# Altium footprint library Indruino.PcbLib: 383 footprints (part 1 of 24)
Each footprint in its own frame and in the unit in brackets; x right, y up, seen from the top. Pads: shape width x height; smd on the part's side, far side on the other; paste and mask are expansions set on the pad; w line width, h text height; cw(c..) or ccw(c..) is an arc to the next point about the centre after c.
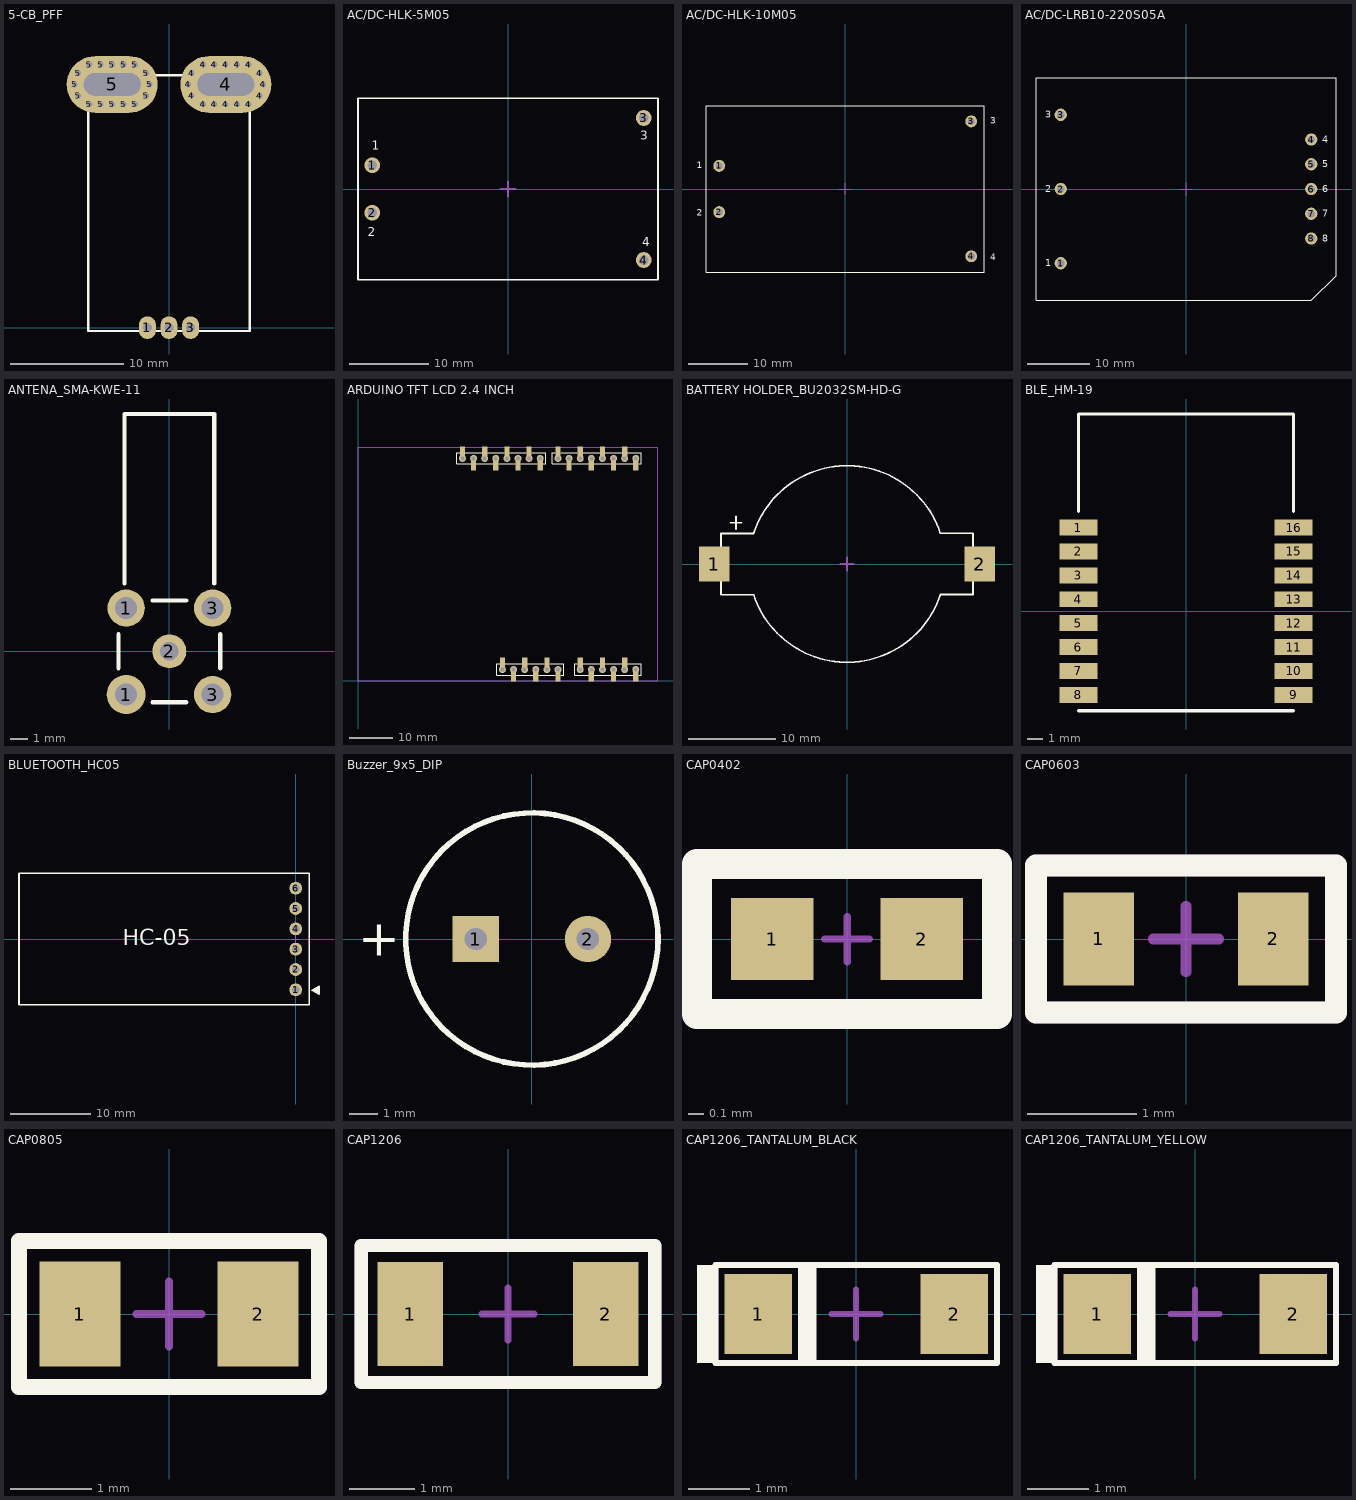
[diagram p0: the footprints below, top view; thin cyan lines are the x and y axes]

## 5-CB_PFF [mm] "ACS759KCB-150B-PFF-T"
pads (37):
  oval 1.5x2 hole 0.8: 1(-1.9,0) 2(0,0) 3(1.9,0)
  round 1 hole 0.5: 4(1.7,21.4) 4(2,20.4) 4(2,22.4) 4(3,19.65) 4(3,23.15) 4(4,19.65) 4(4,23.15) 4(5,19.65) 4(5,23.15) 4(6,19.65) 4(6,23.15) 4(7,19.65) 4(7,23.15) 4(8,20.4) 4(8,22.4) 4(8.3,21.4) 5(-8.3,21.4) 5(-8,20.4) 5(-8,22.4) 5(-7,19.65) 5(-7,23.15) 5(-6,19.65) 5(-6,23.15) 5(-5,19.65) 5(-5,23.15) 5(-4,19.65) 5(-4,23.15) 5(-3,19.65) 5(-3,23.15) 5(-2,20.4) 5(-2,22.4) 5(-1.7,21.4)
  oval 8x5 hole 2 slot 5 at 0 deg: 4(5,21.4) 5(-5,21.4)
Top Overlay:
  lines w0.2: -7.1,-0.3 -7.1,22.2 7.1,22.2 7.1,-0.3 -7.1,-0.3
3D body "User Library-ACS759xCB.step": height 7.1, standoff -3.4, extent -7,-0.25 7,22.09

## AC/DC-HLK-5M05 [mm] "100~240VAC to 5VDC 1A Power Supply Module"
pads (4):
  round 2 hole 1.2: 1(-17.2,3) 2(-17.2,-3) 3(17.2,9) 4(17.2,-9)
Top Overlay:
  lines w0.2: -19,-11.5 -19,11.5 19,11.5 19,-11.5 -19,-11.5
  text "1" at -17.25,5 h1.1
  text "2" at -17.75,-6 h1.1
  text "3" at 16.75,6.25 h1.1
  text "4" at 17,-7.25 h1.1
Mechanical 15:
  lines w0.2: -1,0 1,0 ; 0,-1 0,1
3D body: height 18, standoff 0, extent -19,-11.5 19,11.5

## AC/DC-HLK-10M05 [mm] "85~265VAC to 5VDC 2A Power Supply Module"
pads (4):
  round 2 hole 1.2: 1(-21.25,3.9) 2(-21.25,-3.9) 3(21.25,11.4) 4(21.25,-11.35)
Top Overlay:
  lines w0.2: -23.45,-14 23.45,-14 23.45,14 -23.45,14 -23.45,-14
  text "4" at 24.5,-12 h1.1
  text "3" at 24.5,11 h1.1
  text "2" at -25,-4.5 h1.1
  text "1" at -25,3.5 h1.1
Mechanical 15:
  lines w0.2: -1,0 1,0 ; 0,-1 0,1
3D body: height 21.8, standoff 0, extent -23.45,-14 23.5,14

## AC/DC-LRB10-220S05A [mm] "85~265VAC to 5VDC 2A Power Supply Module"
pads (8):
  round 2 hole 1.2: 1(-20.25,-12) 2(-20.25,0) 3(-20.25,12) 4(20.25,8) 5(20.25,4) 6(20.25,0) 7(20.25,-4) 8(20.25,-8)
Top Overlay:
  lines w0.2: -24.25,-18 20.25,-18 24.25,-14 24.25,18 -24.25,18 -24.25,-18
  text "8" at 22,-8.5 h1.1
  text "7" at 22,-4.5 h1.1
  text "6" at 22,-0.5 h1.1
  text "5" at 22,3.5 h1.1
  text "4" at 22,7.5 h1.1
  text "3" at -22.75,11.5 h1.1
  text "2" at -22.75,-0.5 h1.1
  text "1" at -22.75,-12.5 h1.1
Mechanical 15:
  lines w0.2: -1,0 1,0 ; 0,-1 0,1
3D body: height 20, standoff 0, extent -24.25,-18 24.25,18

## ANTENA_SMA-KWE-11 [mm]
pads (5):
  round 2.3 hole 1.3: 1(-2.55,-2.55)
  round 2.2 hole 1.3: 1(-2.55,2.55) 3(2.55,-2.55) 3(2.55,2.55)
  round 2 hole 1.1: 2(0,0)
Top Overlay:
  lines w0.254: -3,-1 -3,1 ; -2.65,4 -2.65,14 2.65,14 2.65,4 ; -1,-3 1,-3 ; -1,3 1,3 ; 3,-1 3,1
3D body "SMA-KWE-RA-11.STEP": height 7.99, standoff -2.99, extent -3.175,-3 3.175,14

## ARDUINO TFT LCD 2.4 INCH [mm]
pads (56):
  rect 1.2x2.5 smd: 2(63.5,49.3) 3(60.96,52.3) 4(58.42,49.3) 5(55.88,52.3) 6(53.34,49.3) 11(50.8,52.3) 12(48.26,49.3) 13(45.72,52.3) 14(41.656,49.3) 15(39.116,52.3) 16(36.576,49.3) 17(34.036,52.3) 18(31.496,49.3) 19(28.956,52.3) 23(50.8,4.04) 24(53.34,1.04) 25(55.88,4.04) 26(58.42,1.04) 27(60.96,4.04) 28(63.5,1.04) 31(33.02,4.04) 32(35.56,1.04) 33(38.1,4.04) 34(40.64,1.04) 35(43.18,4.04) 36(45.72,1.04) 45(23.876,52.3) 46(26.416,49.3)
  round 1.6 hole 0.9: 2(63.5,50.8) 3(60.96,50.8) 4(58.42,50.8) 5(55.88,50.8) 6(53.34,50.8) 11(50.8,50.8) 12(48.26,50.8) 13(45.72,50.8) 14(41.656,50.8) 15(39.116,50.8) 16(36.576,50.8) 17(34.036,50.8) 18(31.496,50.8) 19(28.956,50.8) 23(50.8,2.54) 24(53.34,2.54) 25(55.88,2.54) 26(58.42,2.54) 27(60.96,2.54) 28(63.5,2.54) 31(33.02,2.54) 32(35.56,2.54) 33(38.1,2.54) 34(40.64,2.54) 35(43.18,2.54) 36(45.72,2.54) 45(23.876,50.8) 46(26.416,50.8)
Top Overlay:
  lines w0.2: 23.241,52.07 22.606,52.07 22.606,49.53 25.781,49.53 ; 24.511,52.07 28.321,52.07 ; 27.051,49.53 30.861,49.53 ; 29.591,52.07 33.401,52.07 ; 32.131,49.53 35.941,49.53 ; 32.385,3.81 31.75,3.81 31.75,1.27 34.925,1.27 ; 33.655,3.81 37.465,3.81 ; 34.671,52.07 38.481,52.07 ; 36.195,1.27 40.005,1.27 ; 37.211,49.53 41.021,49.53 ; 38.735,3.81 42.545,3.81 ; 39.751,52.07 42.926,52.07 42.926,49.53 42.291,49.53 ; 41.275,1.27 45.085,1.27 ; 43.815,3.81 46.99,3.81 46.99,1.27 46.355,1.27 ; 45.085,52.07 44.45,52.07 44.45,49.53 47.625,49.53 ; 46.355,52.07 50.165,52.07 ; 48.895,49.53 52.705,49.53 ; 50.165,3.81 49.53,3.81 49.53,1.27 52.705,1.27 ; 51.435,3.81 55.245,3.81 ; 51.435,52.07 55.245,52.07 ; 53.975,1.27 57.785,1.27 ; 53.975,49.53 57.785,49.53 ; 56.515,3.81 60.325,3.81 ; 56.515,52.07 60.325,52.07 ; 59.055,1.27 62.865,1.27 ; 59.055,49.53 62.865,49.53 ; 61.595,3.81 64.77,3.81 64.77,1.27 64.135,1.27 ; 61.595,52.07 64.77,52.07 64.77,49.53 64.135,49.53
Mechanical 15:
  lines w0.2: 0,0 0,53.34 68.58,53.34 68.58,37.846 68.58,0 66.04,0 0,0
3D body "C061KFXC-RC.STEP": height 7.55, standoff 0.05, extent 49.53,0.4 64.77,4.7
3D body "C081KFXC-RC.STEP": height 7.55, standoff 0.05, extent 44.45,48.66 64.77,52.96
3D body "C101KFXC-RC.STEP": height 7.55, standoff 0.05, extent 17.526,48.66 42.926,52.96
3D body "C081KFXC-RC.STEP": height 7.55, standoff 0.05, extent 26.416,0.95 46.736,5.25

## BATTERY HOLDER_BU2032SM-HD-G [mm]
pads (2):
  rect 3.5x4 smd: 1(-15.25,0) 2(15.25,0)
Top Overlay:
  lines w0.2: -14.5,-2 -14.5,-3.525 -10.746,-3.525 ; -14.5,1.975 -14.5,3.5 -10.746,3.5 ; -13.4,4.75 -12.1,4.75 ; -12.76,4 -12.76,5.5 ; -10.744,3.499 cw(c0,0) 10.737,3.522 ; -10.737,-3.522 ccw(c0,0) 10.744,-3.499 ; 10.746,-3.5 14.5,-3.5 14.5,-1.975 ; 10.746,3.525 14.5,3.525 14.5,2
Mechanical 15:
  lines w0.2: -0.75,0 0.75,0 ; 0,-0.75 0,0.75
3D body "User Library-BU2032SM-HD-G.step": height 5.3, standoff 0, extent -16,-10 16,10
3D body "CR2032.stp": height 5.2, standoff 1.7, extent -10,-10 10,10

## BLE_HM-19 [mm] "BLUETOOTH LOW ENERGY"
height 1.5
pads (16):
  rect 2.4x1 smd: 1(-6.75,5.25) 2(-6.75,3.75) 3(-6.75,2.25) 4(-6.75,0.75) 5(-6.75,-0.75) 6(-6.75,-2.25) 7(-6.75,-3.75) 8(-6.75,-5.25) 9(6.75,-5.25) 10(6.75,-3.75) 11(6.75,-2.25) 12(6.75,-0.75) 13(6.75,0.75) 14(6.75,2.25) 15(6.75,3.75) 16(6.75,5.25)
Top Overlay:
  lines w0.2: -6.75,-6.25 6.75,-6.25 ; -6.75,6.25 -6.75,12.375 6.75,12.375 6.75,6.25
3D body "HM11.stp": height 1.8, standoff 0, extent -6.75,-6.125 6.75,12.375

## BLUETOOTH_HC05 [mm]
pads (6):
  round 1.6 hole 0.9: 1(0,-6.35) 2(0,-3.81) 3(0,-1.27) 4(0,1.27) 5(0,3.81) 6(0,6.35)
Top Overlay:
  region: 2.021,-6.41 2.91,-5.902 2.91,-6.918
  lines w0.2: -34.6,-8.2 1.7,-8.2 1.7,8.2 -34.6,8.2 -34.6,-8.2 ; 2.021,-6.41 2.91,-5.902 2.91,-6.918 2.021,-6.41
  text "HC-05" at -21.6,-0.8 h2
Mechanical 15:
  lines w0.1: -0.5,0 0.5,0 ; 0,-0.5 0,0.5
3D body "User Library-HC05-Bluetooth.step": height 12.55, standoff 10.68, extent -34.43,-8 1.57,8
3D body "User Library-ZL262-3SG.step": height 8.4, standoff -3.15, extent -1.25,0 1.25,7.62
3D body "User Library-ZL262-3SG.step": height 8.4, standoff -3.15, extent -1.25,-7.62 1.25,0
3D body "header_6x1pin_male.stp": height 14, standoff 2.46, extent -1.27,-7.62 1.27,7.62

## Buzzer_9x5_DIP [mm] "2PIN, 3.5mm pitch, 0.8mm pin width"
pads (2):
  rect 1.65x1.65 hole 0.8: 1(-2,0)
  round 1.65 hole 0.8: 2(2,0)
Top Overlay:
  circle w0.2: c0,0 r4.5
  text "+" at -6.2,-0.6 h1.3
3D body "cst-951ap.stp": height 4.5, standoff -4.5, extent -4.5,-4.5 4.5,4.5

## CAP0402 [mm]
pads (2):
  rect 0.55x0.55 smd: 1(-0.5,0) 2(0.5,0)
Top Overlay:
  lines w0.2: -1,-0.5 1,-0.5 1,0.5 -1,0.5 -1,-0.5
Mechanical 13:
  lines w0.2: -1,-0.5 1,-0.5 1,0.5 -1,0.5 -1,-0.5
  text "'.Designator'" at -0.7,-0.233 h0.5
Mechanical 15:
  lines w0.05: -0.15,0 0.15,0 ; 0,-0.15 0,0.15
3D body "User Library-cap_0402.STEP": height 0.5, standoff 0, extent -0.5,-0.25 0.5,0.25

## CAP0603 [mm]
pads (2):
  rect 0.65x0.85 smd: 1(-0.8,0) 2(0.8,0)
Top Overlay:
  lines w0.2: -1.375,-0.675 1.375,-0.675 1.375,0.675 -1.375,0.675 -1.375,-0.675
Mechanical 13:
  lines w0.2: -1.375,-0.675 1.375,-0.675 1.375,0.675 -1.375,0.675 -1.375,-0.675
  text "'.Designator'" at -1.03,-0.397 h0.7
Mechanical 15:
  lines w0.1: -0.3,0 0.3,0 ; 0,-0.3 0,0.3
3D body "User Library-cap_0603-1.STEP": height 0.79, standoff -0.01, extent -0.8,-0.4 0.8,0.4

## CAP0805 [mm]
pads (2):
  rect 1x1.3 smd: 1(-1.1,0) 2(1.1,0)
Top Overlay:
  lines w0.2: -1.85,-0.9 -1.85,0.9 1.85,0.9 1.85,-0.9 -1.85,-0.9
Mechanical 13:
  lines w0.2: -1.85,-0.9 1.85,-0.9 1.85,0.9 -1.85,0.9 -1.85,-0.9
  text "'.Designator'" at -1.475,-0.458 h0.8
Mechanical 15:
  lines w0.1: -0.4,0 0.4,0 ; 0,-0.4 0,0.4
3D body "cap_2012.stp": height 0.65, standoff -0.03, extent -1.2,-0.73 1.2,0.73

## CAP1206 [mm]
pads (2):
  rect 1x1.6 smd: 1(-1.5,0) 2(1.5,0)
Top Overlay:
  lines w0.2: -2.25,-1.05 2.25,-1.05 2.25,1.05 -2.25,1.05 -2.25,-1.05
Mechanical 13:
  lines w0.2: -2.25,-1.05 2.25,-1.05 2.25,1.05 -2.25,1.05 -2.25,-1.05
  text "'.Designator'" at -1.8,-0.383 h0.8
Mechanical 15:
  lines w0.1: -0.4,0 0.4,0 ; 0,-0.4 0,0.4
3D body "User Library-CAPC3216X10.STEP": height 1, standoff 0, extent -1.6,-0.8 1.6,0.8

## CAP1206_TANTALUM_BLACK [mm]
pads (2):
  rect 1.1x1.3 smd: 1(-1.6,0) 2(1.6,0)
Top Overlay:
  rectangle: -0.95,-0.8 -0.65,0.8
  rectangle: -2.6,-0.8 -2.3,0.8
  lines w0.1: -2.3,-0.8 -2.3,0.8 2.3,0.8 2.3,-0.8 -2.3,-0.8
Mechanical 13:
  lines w0.1: -2.3,-0.8 2.3,-0.8 2.3,0.8 -2.3,0.8 -2.3,-0.8
Mechanical 15:
  lines w0.1: -0.4,0 0.4,0 ; 0,-0.4 0,0.4
3D body "User Library-cap3216h160.step": height 1.65, standoff 0.05, extent -1.6,-0.8 1.6,0.8

## CAP1206_TANTALUM_YELLOW [mm]
pads (2):
  rect 1.1x1.3 smd: 1(-1.6,0) 2(1.6,0)
Top Overlay:
  rectangle: -0.95,-0.8 -0.65,0.8
  rectangle: -2.6,-0.8 -2.3,0.8
  lines w0.1: -2.3,-0.8 -2.3,0.8 2.3,0.8 2.3,-0.8 -2.3,-0.8
Mechanical 13:
  lines w0.1: -2.3,-0.8 2.3,-0.8 2.3,0.8 -2.3,0.8 -2.3,-0.8
Mechanical 15:
  lines w0.1: -0.4,0 0.4,0 ; 0,-0.4 0,0.4
3D body "User Library-CAP_TANT_3216-18_A_case-1.step": height 1.75, standoff 0.05, extent -1.7,-0.9 1.7,0.9